# Altium footprint library PcbLib_Microcontroller.PcbLib: 9 footprints
Each footprint in its own frame and in the unit in brackets; x right, y up, seen from the top. Pads: shape width x height; smd on the part's side, far side on the other; paste and mask are expansions set on the pad; w line width, h text height; cw(c..) or ccw(c..) is an arc to the next point about the centre after c.
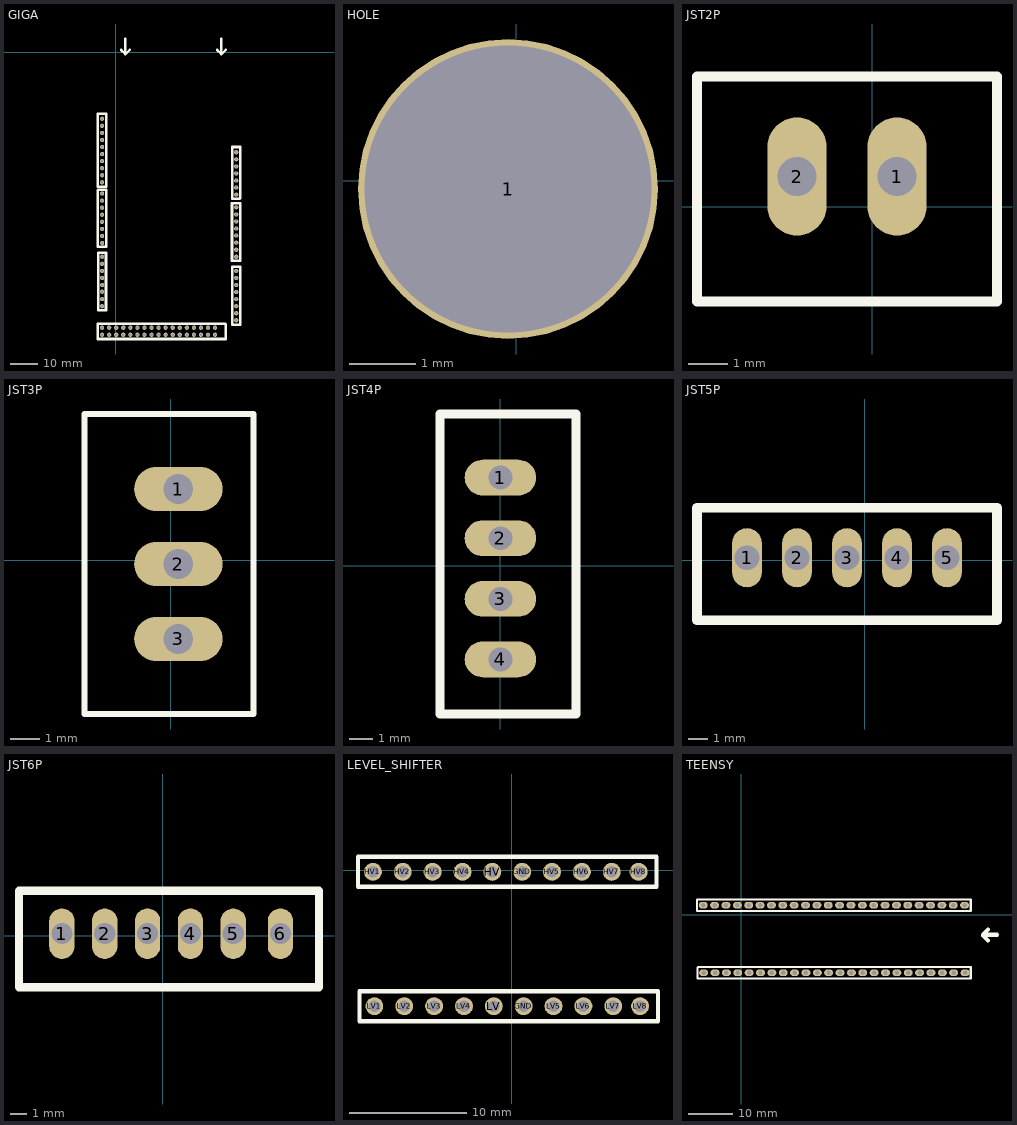
[diagram p0: the footprints below, top view; thin cyan lines are the x and y axes]

## GIGA [mil]
pads (83):
  round 60 hole 39.37: 0(-190,-2700) 1(-190,-2600) 2(-190,-2500) 3(-190,-2400) 3.3V(1710,-1615) 4(-190,-2300) 5(-190,-2200) 5V(1710,-1715) 6(-190,-2100) 7(-190,-2000) 8(-190,-1840) 9(-190,-1740) 10(-190,-1640) 11(-190,-1540) 12(-190,-1440) 13(-190,-1340) 14(-190,-2895) 15(-190,-2995) 16(-190,-3095) 17(-190,-3195) 18(-190,-3295) 19(-190,-3390) 20(-190,-3495) 21(-190,-3595) 22(1310,-3900) 23(1310,-4000) 24(1210,-3900) 25(1210,-4000) 26(1110,-3900) 27(1110,-4000) 28(1010,-3900) 29(1010,-4000) 30(910,-3900) 31(910,-4000) 32(810,-3900) 33(810,-4000) 34(710,-3900) 35(710,-4000) 36(610,-3900) 37(610,-4000) 38(510,-3900) 39(510,-4000) 40(410,-3900) 41(410,-4000) 42(310,-3900) 43(310,-4000) 44(210,-3900) 45(210,-4000) 46(110,-3900) 47(110,-4000) 48(10,-3900) 49(10,-4000) 50(-90,-3900) 51(-90,-4000) 52(-190,-3900) 53(-190,-4000) A0(1710,-2195) A1(1710,-2295) A2(1710,-2395) A3(1710,-2495) A4(1710,-2595) A5(1710,-2695) A6(1710,-2795) A7(1710,-2895) A8(1710,-3095) A9(1710,-3195) A10(1710,-3295) A11(1710,-3395) AREF(-190,-1140) CANT0(1710,-3695) CANT1(1710,-3795) DAC0(1710,-3495) DAC1(1710,-3595) GND(-190,-1240) GND(1410,-4000) GND(1410,-3900) GND(1710,-1915) GND(1710,-1815) IOREF(1710,-1415) RESET(1710,-1515) SCL1(-190,-940) SDA1(-190,-1040) Vin(1710,-2015)
Top Overlay:
  lines w35.43: 80,35 140,-25 ; 140,190 140,-25 ; 202.5,37.5 140,-25 ; 1440,35 1500,-25 ; 1500,190 1500,-25 ; 1562.5,37.5 1500,-25 ; -255,-1895 -250,-1900 -135,-1900 -130,-1895 -130,-870 -255,-870 -255,-1895 ; -250,-4060 1560,-4060 1560,-3850 1555,-3845 -250,-3845 -250,-4060 ; -250,-2755 -250,-1950 -245,-1945 -130,-1945 -130,-1950 -130,-2750 -135,-2755 -250,-2755 ; -245,-3650 -245,-2835 -135,-2835 -135,-3650 -245,-3650 ; 1650,-2950 1650,-2945 1650,-2140 1765,-2140 1765,-2950 1755,-2950 1650,-2950 ; 1655,-3855 1655,-3850 1655,-3035 1770,-3035 1770,-3855 1655,-3855 ; 1655,-2070 1655,-2065 1655,-1340 1765,-1340 1765,-2065 1760,-2070 1655,-2070
3D body "2x18 Male Pin Header.STEP": height 394.2, standoff -138.87, extent -240,-4048.43 1560.2,-3851.57
3D body "1x8 Male Pin Header.STEP": height 394.2, standoff -138.87, extent -239.21,-3645.2 -140.79,-2845
3D body "1x8 Male Pin Header.STEP": height 394.2, standoff -138.87, extent 1660.79,-2945.2 1759.21,-2145
3D body "1x8 Male Pin Header.STEP": height 394.2, standoff -138.87, extent 1660.79,-3845 1759.21,-3044.8
3D body "1x8 Male Pin Header.STEP": height 394.2, standoff -138.87, extent 1660.79,-2065.2 1759.21,-1265
3D body "1x8 Male Pin Header.STEP": height 394.2, standoff -138.87, extent -239.21,-2750 -140.79,-1949.8
3D body "1x10 Male Pin Header.STEP": height 394.2, standoff -138.87, extent -239.21,-1890 -140.79,-889.8
3D body "GIGA_R1_WIFI.step": height 416.59, standoff -59.06, extent -290,-4195 1810,-100.5

## HOLE [mm]
pads (1):
  round 4.5 hole 4.3 unplated: 1(-0.127,-0.127)

## JST2P [mm]
pads (2):
  oval 1.5x3 hole 1: 1(0.635,0.762) 2(-1.905,0.762)
Top Overlay:
  lines w0.25: -4.445,-2.413 -4.445,3.302 3.175,3.302 3.175,-2.413 -4.445,-2.413
3D body "JST 2.54X2P.step": height 7.01, standoff -2.99, extent -4.405,-2.398 3.135,3.302

## JST3P [mm]
pads (3):
  oval 3x1.5 hole 1: 1(0.254,2.413) 2(0.254,-0.127) 3(0.254,-2.667)
Top Overlay:
  lines w0.2: -2.921,-5.207 -2.921,4.953 2.794,4.953 2.794,-5.207 -2.921,-5.207
3D body "JST 2.54X3P.step": height 7, standoff -3, extent -2.896,-5.147 2.804,4.933

## JST4P [mm]
pads (4):
  oval 3x1.5 hole 1: 1(0,3.683) 2(0,1.143) 3(0,-1.397) 4(0,-3.937)
Top Overlay:
  lines w0.381: -2.54,-6.223 3.175,-6.223 3.175,6.35 -2.54,6.35 -2.54,-6.223
3D body "JST 2.54X4P.step": height 7, standoff -3, extent -2.55,-6.457 3.15,6.163

## JST5P [mm]
pads (5):
  oval 1.5x3 hole 1.25: 1(-5.969,0.127) 2(-3.429,0.127) 3(-0.889,0.127) 4(1.651,0.127) 5(4.191,0.127)
Top Overlay:
  lines w0.5: -8.509,-3.048 6.731,-3.048 6.731,2.667 -8.509,2.667 -8.509,-3.048
3D body "JST 2.54x5P.step": height 7, standoff -3, extent -8.489,-3.023 6.671,2.677

## JST6P [mm]
pads (6):
  oval 1.5x3 hole 1.25: 1(-5.969,0.127) 2(-3.429,0.127) 3(-0.889,0.127) 4(1.651,0.127) 5(4.191,0.127) 6(6.985,0.127)
Top Overlay:
  lines w0.5: -8.509,-3.048 9.271,-3.048 9.271,2.667 -8.509,2.667 -8.509,-3.048
3D body "JST 2.54x6P.step": height 7, standoff -3, extent -8.489,-3.023 9.211,2.677

## LEVEL_SHIFTER [mil]
pads (20):
  round 60 hole 39.37: GND(35,-5) GND(40,-455) HV(-65,-5) HV1(-465,-5) HV2(-365,-5) HV3(-265,-5) HV4(-165,-5) HV5(135,-5) HV6(235,-5) HV7(335,-5) HV8(425,-5) LV(-60,-455) LV2(-360,-455) LV3(-260,-455) LV4(-160,-455) LV5(140,-455) LV6(240,-455) LV7(340,-455) LV8(430,-455)
  oval 59.06x60 hole 39.37: LV1(-460,-455)
Top Overlay:
  lines w15: -515,-55 485,-55 485,45 -515,45 -515,-55 ; -510,-505 490,-505 490,-405 -510,-405 -510,-505
3D body "1x10 header.STEP": height 393.7, standoff -300.79, extent -510,-505 490,-405
3D body "1x10 header.STEP": height 393.7, standoff -300.79, extent -515,-55 485,45

## TEENSY [mm]
pads (48):
  oval 2x1.5 hole 1: 0(47.371,2.159) 1(44.831,2.159) 2(42.291,2.159) 3(39.751,2.159) 3.3V(14.351,2.159) 3.3V(44.928,-12.95) 4(37.211,2.159) 5(34.671,2.159) 6(32.131,2.159) 7(29.591,2.159) 8(27.051,2.159) 9(24.511,2.159) 10(21.971,2.159) 11(19.431,2.159) 12(16.891,2.159) 13(16.988,-12.95) 14(19.528,-12.95) 15(22.068,-12.95) 16(24.608,-12.95) 17(27.148,-12.95) 18(29.688,-12.95) 19(32.228,-12.95) 20(34.768,-12.95) 21(37.308,-12.95) 22(39.848,-12.95) 23(42.388,-12.95) 24(11.811,2.159) 25(9.271,2.159) 26(6.731,2.159) 27(4.191,2.159) 28(1.651,2.159) 29(-0.889,2.159) 30(-3.429,2.159) 31(-5.969,2.159) 32(-8.509,2.159) 33(-8.412,-12.95) 34(-5.872,-12.95) 35(-3.332,-12.95) 36(-0.792,-12.95) 37(1.748,-12.95) 38(4.288,-12.95) 39(6.828,-12.95) 40(9.368,-12.95) 41(11.908,-12.95) GND(14.448,-12.95) GND(47.468,-12.95) GND(49.911,2.159) Vin(50.008,-12.954)
Top Overlay:
  lines w0.5: -9.906,0.889 51.308,0.889 51.308,3.429 -9.906,3.429 -9.906,0.889 ; -9.779,-14.224 -9.779,-11.811 -9.652,-11.684 51.308,-11.684 51.308,-14.224 -9.779,-14.224
  lines w0.9: 55.118,-5.715 53.975,-4.572 53.975,-4.445 ; 55.118,-3.302 53.975,-4.445 ; 57.15,-4.445 53.975,-4.445
3D body "1x6.STEP": height 8.89, standoff -8.75, extent 35.941,-14.224 51.181,-11.684
3D body "1x6.STEP": height 8.89, standoff -8.75, extent 35.941,0.889 51.181,3.429
3D body "1x5.STEP": height 8.89, standoff -8.75, extent 23.241,-14.224 35.941,-11.684
3D body "1x5.STEP": height 8.89, standoff -8.75, extent 23.241,0.889 35.941,3.429
3D body "Teensy 4.1.STEP": height 13.47, standoff 8.22, extent -10.16,-14.224 51.726,3.556
3D body "1x6.STEP": height 8.89, standoff -8.75, extent -9.779,0.889 5.461,3.429
3D body "1x7.STEP": height 8.89, standoff -8.75, extent 5.427,0.894 23.207,3.434
3D body "1x6.STEP": height 8.89, standoff -8.75, extent -9.682,-14.22 5.558,-11.68
3D body "1x7.STEP": height 8.89, standoff -8.75, extent 5.524,-14.215 23.304,-11.675